# Altium footprint library hphonglib.PcbLib: 1250 footprints (part 24 of 79)
Each footprint in its own frame and in the unit in brackets; x right, y up, seen from the top. Pads: shape width x height; smd on the part's side, far side on the other; paste and mask are expansions set on the pad; w line width, h text height; cw(c..) or ccw(c..) is an arc to the next point about the centre after c.
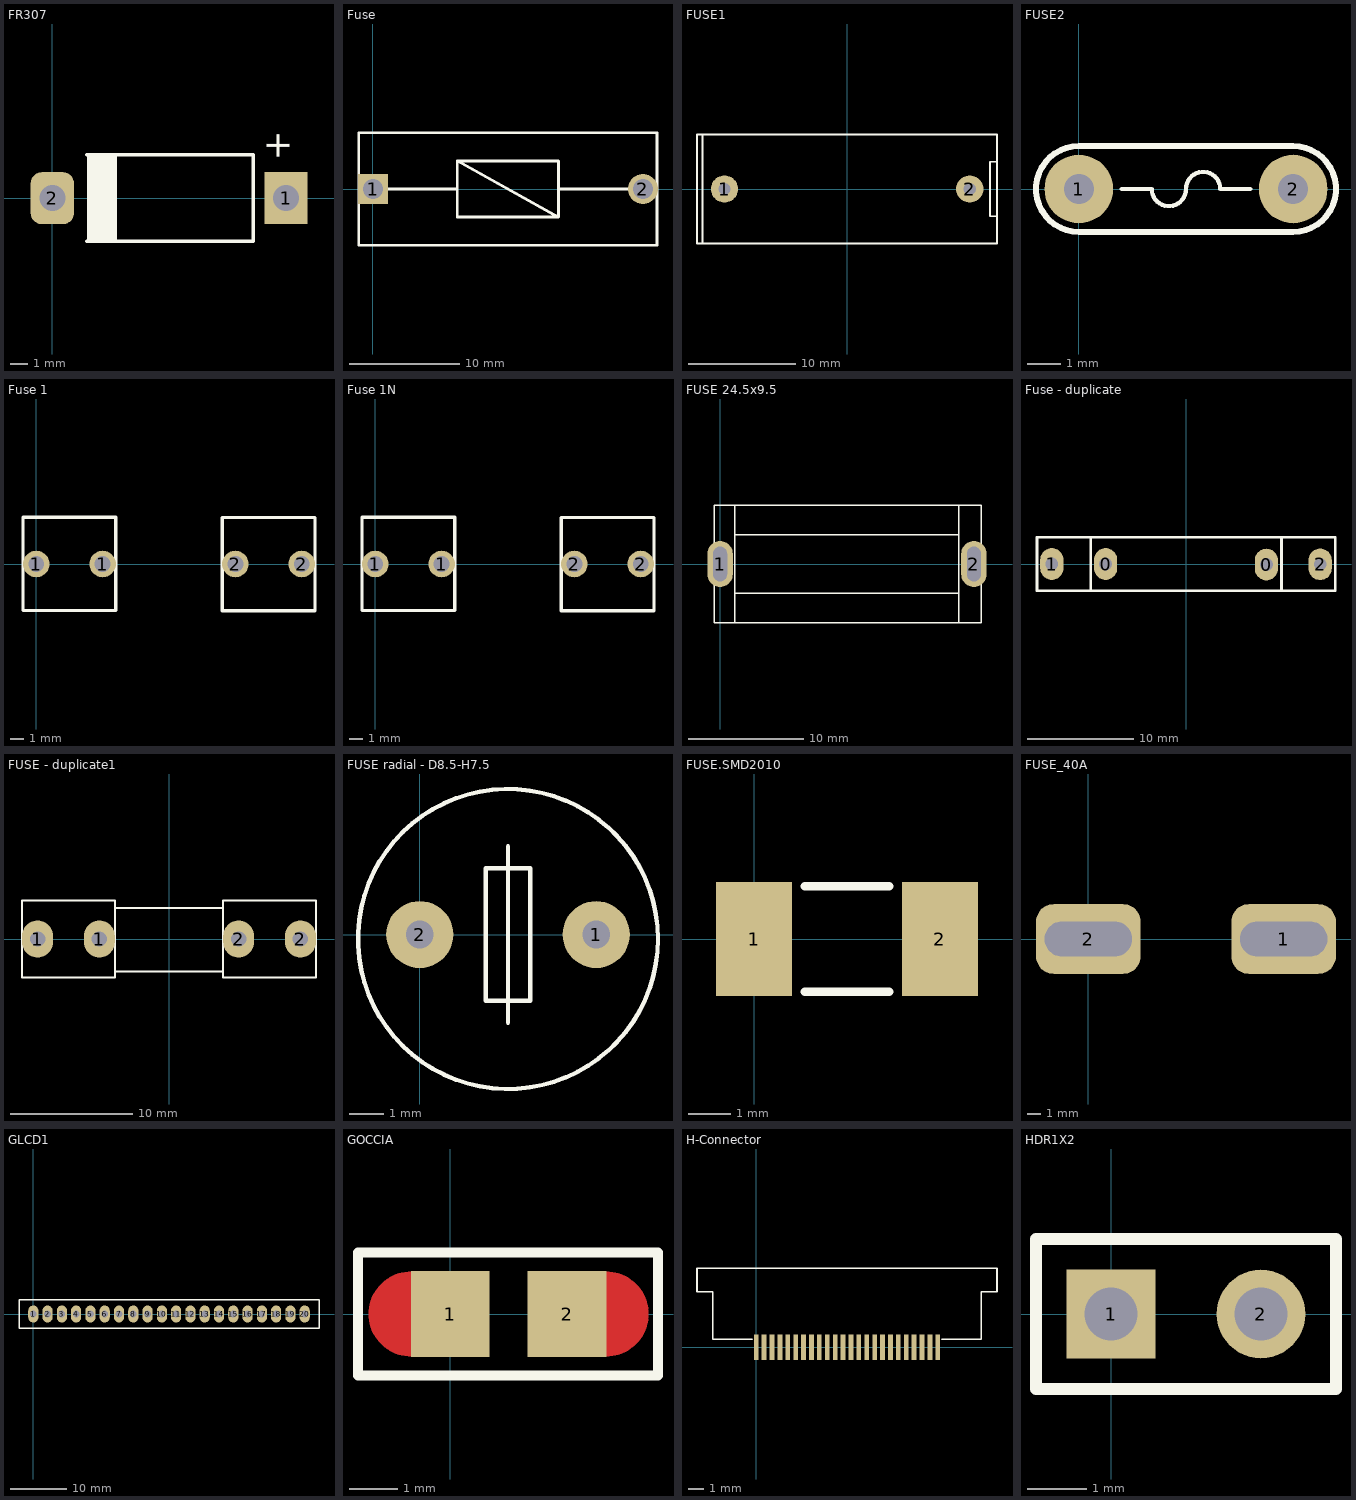
[diagram p23: the footprints below, top view; thin cyan lines are the x and y axes]

## FR307 [mm]
height 2.8
pads (2):
  rect 2.5x3 hole 1.5: 1(13.5,0)
  rrect50% 2.5x3 hole 1.5: 2(0,0)
Top Overlay:
  rectangle: 1.995,-2.525 3.74,2.5
  lines w0.2: 1.995,-2.5 11.595,-2.5 ; 1.995,2.5 11.595,2.5 11.595,-2.475
  text "+" at 13.716,2.159 h1.52
Bottom Overlay:
  lines w0.254: -1.925,-2.625 -1.925,2.6 -1.575,2.6 15.4,2.6 15.4,-2.625 -1.925,-2.625
3D body "Diode.STEP": height 5.65, standoff -3, extent -1.368,-2.692 14.932,2.608

## Fuse [mil] "Fuse Box; 2 Leads; Solder Pad 35mil"
pads (2):
  rect 107x107 hole 72: 1(0.67,0)
  round 107 hole 72: 2(960,0)
Top Overlay:
  lines w10: 0,0 300,0 ; 660,0 960,0 ; 300,100 660,-100 ; 300,100 660,100 660,-100 ; 300,100 300,-100 660,-100 ; -50,-200 1010,-200 1010,200 -50,200 -50,-200
3D body "User Library-Portafusible Europeo CI.STEP": height 81.43, standoff -430.39, extent -12.12,-177.33 972.12,177

## FUSE1 [mil] "De Fuse Box"
pads (2):
  round 100 hole 45: 1(-450,0) 2(450,0)
Top Overlay:
  lines w7: -531,-199 -531,200 ; 549,-100 525,-100 524,-99 524,100 550,100 ; -551,-200 -551,200 550,200 550,-200 -551,-200

## FUSE2 [mil] "Fuse"
pads (2):
  round 80 hole 35: 1(0,0) 2(250,0)
Top Overlay:
  lines w5: 50,0 85,0 ccw(c105,0) 125,0 cw(c145,0) 165,0 200,0
  lines w7: 0,-50 cw(c0,0) 0,50 250,50 cw(c250,0) 250,-50 0,-50

## Fuse 1 [mm]
pads (4):
  round 2 hole 1.2: 1(0,0) 1(5,0) 2(15,0) 2(20,0)
Top Overlay:
  lines w0.254: -1,-3.5 6,-3.5 6,3.525 -1,3.525 -1,-3.5 ; 14,-3.525 14,3.5 21,3.5 21,-3.525 14,-3.525
Bottom Overlay:
  lines w0.254: -1.3,-3.525 -1.3,3.475 -1,3.475 21.3,3.475 21.3,-3.525 -1.3,-3.525
3D body: height 6.98, standoff 3, extent 5.775,-2 14.275,1.992
3D body: height 6.98, standoff 3, extent 14.25,-1.992 19.25,2
3D body: height 6.98, standoff 3, extent 0.775,-2 5.775,1.992
3D body: height 8, standoff 0.1, extent 15,2.25 20,2.525
3D body: height 8, standoff 0.1, extent 15,-2.55 20,-2.25
3D body: height 8, standoff 0.1, extent 0,-2.575 5,-2.25
3D body: height 8, standoff 0.1, extent 0,2.25 5,2.575
3D body: height 1, standoff 0.1, extent -0.025,-2.25 4.975,2.25
3D body: height 1, standoff 0.1, extent 15.025,-2.25 20.025,2.25

## Fuse 1N [mm]
pads (4):
  round 2 hole 1.2: 1(0,0) 1(5,0) 2(15,0) 2(20,0)
Top Overlay:
  lines w0.254: -1,-3.5 6,-3.5 6,3.525 -1,3.525 -1,-3.5 ; 14,-3.525 14,3.5 21,3.5 21,-3.525 14,-3.525
Bottom Overlay:
  lines w0.254: -1.3,-3.525 -1.3,3.475 -1,3.475 21.3,3.475 21.3,-3.525 -1.3,-3.525
3D body "Fuse Leg_2009.STEP": height 9.6, standoff -3.3, extent -0.66,-3.099 5.436,3.091
3D body "Fuse Leg_2009.STEP": height 9.6, standoff -3.3, extent 14.503,-3.15 20.599,3.041
3D body: height 6.98, standoff 3, extent 5.775,-2.025 14.275,1.967
3D body: height 6.98, standoff 3, extent 14.25,-2.018 19.25,1.975
3D body: height 6.98, standoff 3, extent 0.775,-2.025 5.775,1.967

## FUSE 24.5x9.5 [mm]
pads (2):
  oval 2.2x4 hole 1.2 slot 3 at 90 deg unplated: 1(0,0) 2(22,0)
Top Overlay:
  lines w0.127: 1.27,-2.54 20.625,-2.54 ; 1.27,2.54 20.65,2.54 ; 1.27,-5.08 20.69,-5.08 ; 1.27,-5.08 1.27,5.08 ; 1.27,-5.08 -0.508,-5.08 -0.508,5.08 1.27,5.08 ; 1.27,5.08 20.69,5.08 ; 20.69,-5.08 20.69,5.08 ; 20.69,-5.08 22.625,-5.08 22.625,5.08 20.69,5.08
  lines w1: 0,-0.975 0,1.025 ; 22,-1 22,1
3D body: height 6.98, standoff 3, extent 1.664,-2.025 6.664,1.967
3D body: height 6.98, standoff 3, extent 15.139,-2.018 20.139,1.975
3D body: height 6.98, standoff 3, extent 6.664,-2.025 15.164,1.967
3D body "Fuse box.STEP": height 11.5, standoff -1.87, extent -1.278,-4.597 23.122,4.803

## Fuse - duplicate [mm]
pads (4):
  oval 2.2x3 hole 1.2: 0(-7.62,0) 0(7.595,-0.051) 1(-12.7,0) 2(12.675,-0.025)
Top Overlay:
  lines w0.254: -9.017,-2.54 -9.017,2.54 ; 9.017,-2.54 9.017,2.54 ; -14.097,-2.54 -14.097,2.54 14.097,2.54 14.097,-2.54 -14.097,-2.54
3D body "SW3DPS-FUSE-DEFAULT.step": height 8.84, standoff -4.01, extent -15.44,-2.952 15.44,2.952

## FUSE - duplicate1 [mil] "De Fuse"
pads (4):
  oval 100x120 hole 50: 1(-425,0) 1(-225,0) 2(225,0) 2(425,0)
Top Overlay:
  lines w7: -175,-105 175,-105 ; -175,100 175,100 ; -475,-125 -475,125 -175,125 -175,-125 -475,-125 ; 175,-125 475,-125 475,125 175,125 175,-125
3D body "SW3dPS-Fuse Leg_2009.STEP": height 377.88, standoff -129.94, extent 219,-116.71 459,127
3D body "SW3dPS-Fuse Small 1A.STEP": height 370.39, standoff 169.61, extent -384.8,-98 390.8,102.79
3D body "SW3dPS-Fuse Leg_2009.STEP": height 377.88, standoff -129.94, extent -448,-117 -208,126.71

## FUSE radial - D8.5-H7.5 [mil]
pads (2):
  round 76 hole 31.49 unplated: 1(200,0) 2(0,0)
Top Overlay:
  circle w5: c100,-5 r170
  lines w5: 100,-100 100,100 ; 75,-75 75,75 125,75 125,-75 75,-75

## FUSE.SMD2010 [mm] "2010 Body 5.0 x 2.5 mm (LxW typ)"
height 0.6
pads (2):
  rect 1.8x2.7 smd: 1(0,0) 2(4.4,0)
Top Overlay:
  lines w0.2: 1.2,-1.25 3.2,-1.25 ; 1.2,1.25 3.2,1.25

## FUSE_40A [mil]
pads (2):
  rrect50% 300x200 hole 100 slot 250 at 0 deg: 1(560,0) 2(0,0)

## GLCD1 [mm]
pads (20):
  oval 1.8x3 hole 1.2: 1(0,0) 2(2.54,0) 3(5.08,0) 4(7.62,0) 5(10.16,0) 6(12.7,0) 7(15.24,0) 8(17.78,0) 9(20.32,0) 10(22.86,0) 11(25.4,0) 12(27.94,0) 13(30.48,0) 14(33.02,0) 15(35.56,0) 16(38.1,0) 17(40.64,0) 18(43.18,0) 19(45.72,0) 20(48.26,0)
Top Overlay:
  lines w0.254: -2.54,-2.54 50.8,-2.54 50.8,2.54 -2.54,2.54 -2.54,-2.54

## GOCCIA [mil] "Goccia a stagno"
height 5
pads (2):
  rect 64x70 smd: 1(0,0) 2(95,0)
Top Layer:
  lines w35: -32,-17 cw(c-32,0) -32,17 ; 127,-17 ccw(c127,0) 127,17
Top Overlay:
  lines w8: -75,-50 169,-50 169,50 -75,50 -75,-50
Top Paste:
  lines w35: -32,-17 cw(c-32,0) -32,17 ; 127,-17 ccw(c127,0) 127,17
Top Solder:
  lines w39: -36,-19 cw(c-36,0) -36,19 ; 130,-19 ccw(c130,0) 130,19

## H-Connector [mm]
pads (24):
  rect 0.3x1.6 smd: 1(0,0) 2(0.5,0) 3(1,0) 4(1.5,0) 5(2,0) 6(2.5,0) 7(3,0) 8(3.5,0) 9(4,0) 10(4.5,0) 11(5,0) 12(5.5,0) 13(6,0) 14(6.5,0) 15(7,0) 16(7.5,0) 17(8,0) 18(8.5,0) 19(9,0) 20(9.5,0) 21(10,0) 22(10.5,0) 23(11,0) 24(11.5,0)
Top Overlay:
  lines w0.1: -0.25,0.5 -2.75,0.5 -2.75,3.5 -3.75,3.5 -3.75,5 -0.975,5 15.25,5 15.25,3.5 14.25,3.5 14.25,0.5 11.75,0.5

## HDR1X2 [mm] "Connector; Header; 2 Position"
pads (2):
  rect 1.5x1.5 hole 0.9: 1(0,0)
  round 1.5 hole 0.9: 2(2.54,0)
Top Overlay:
  lines w0.2: -1.27,-1.27 -1.27,1.27 3.81,1.27 3.81,-1.27 -1.27,-1.27
3D body: height 1.5, standoff 0, extent 1.27,-1.27 3.81,1.27
3D body: height 7, standoff -1, extent 2.134,-0.406 2.93,0.392
3D body: height 7, standoff -1, extent -0.406,-0.406 0.39,0.392
3D body: height 1.5, standoff 0, extent -1.27,-1.27 1.27,1.27